# Altium footprint library Mylib.PcbLib: 320 footprints (part 3 of 20)
Each footprint in its own frame and in the unit in brackets; x right, y up, seen from the top. Pads: shape width x height; smd on the part's side, far side on the other; paste and mask are expansions set on the pad; w line width, h text height; cw(c..) or ccw(c..) is an arc to the next point about the centre after c.
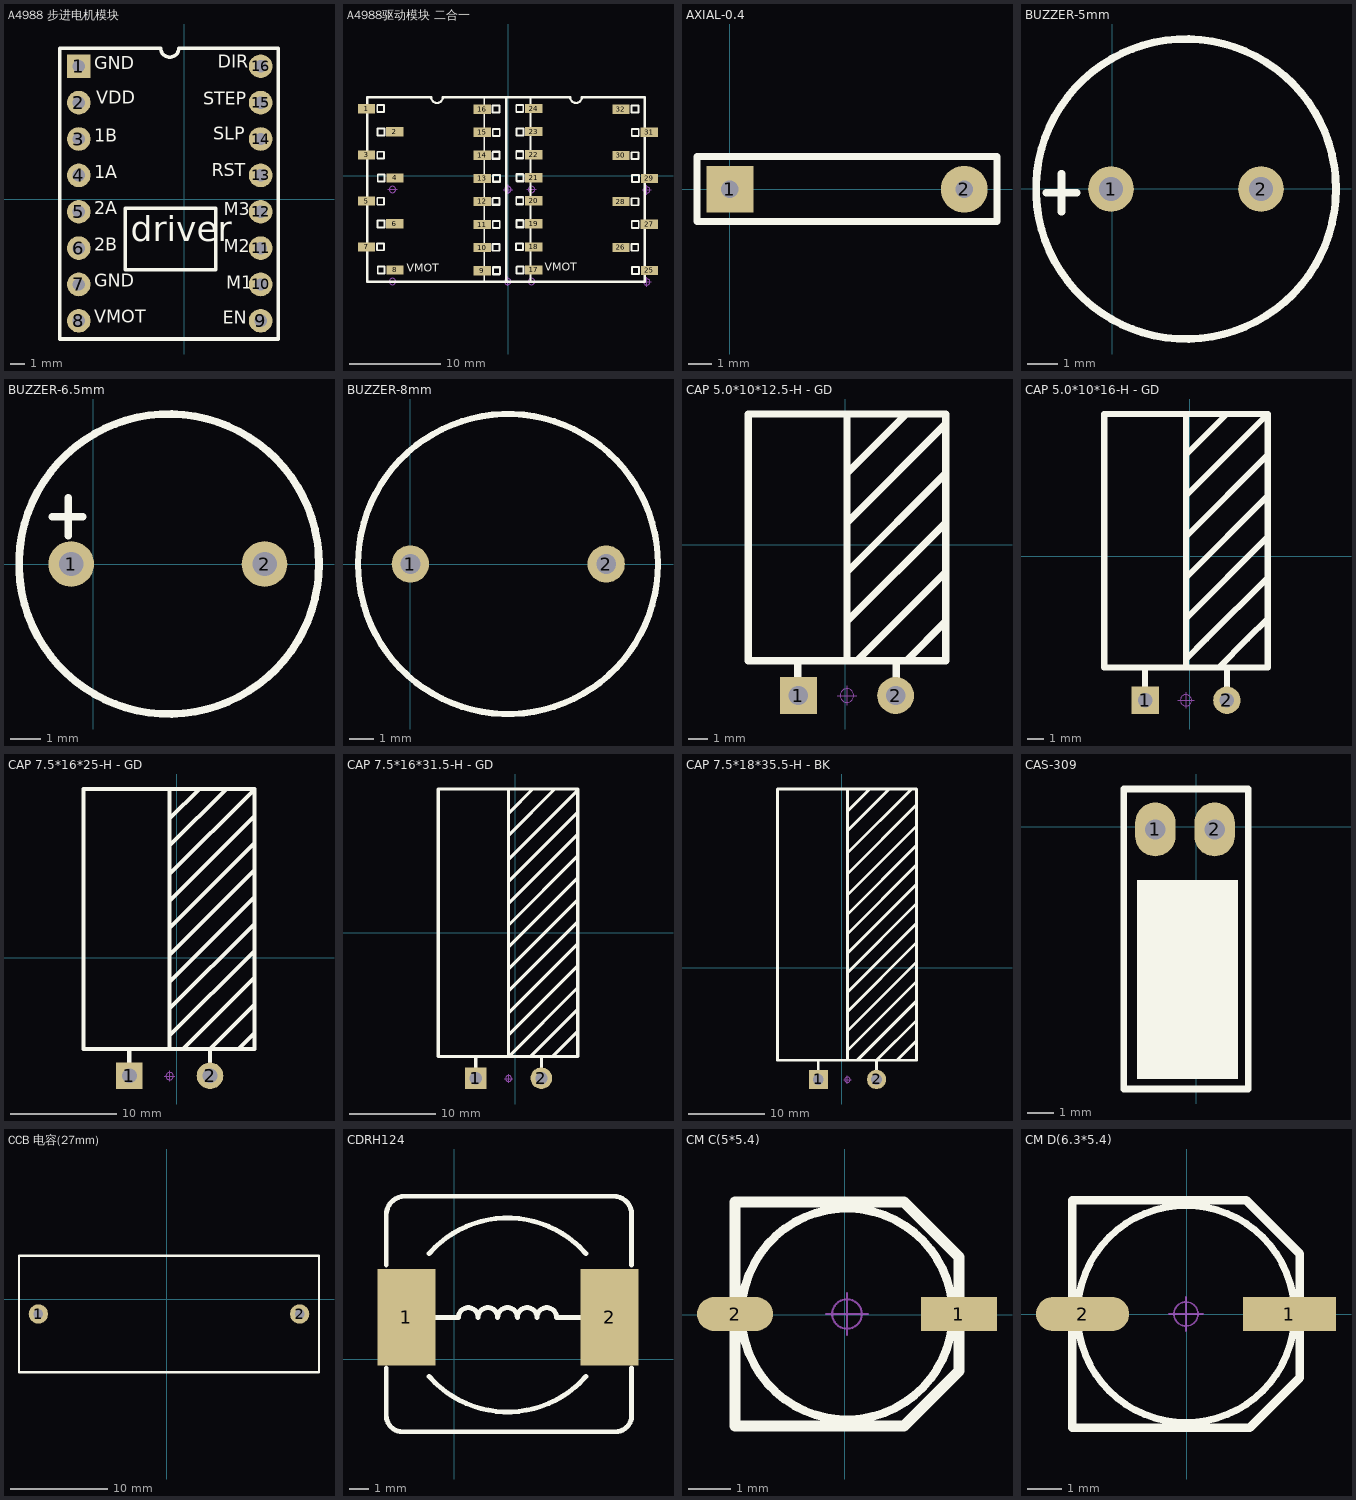
[diagram p2: the footprints below, top view; thin cyan lines are the x and y axes]

## A4988 步进电机模块 [mil] "步进电机模块"
pads (16):
  rect 65x65 hole 34: 1(-290,366)
  round 65 hole 34: 2(-290,266) 3(-290,166) 4(-290,66) 5(-290,-34) 6(-290,-134) 7(-290,-234) 8(-290,-334) 9(210,-334) 10(210,-234) 11(210,-134) 12(210,-34) 13(210,66) 14(210,166) 15(210,266) 16(210,366)
Top Overlay:
  lines w10: -342,-384 -342,416 -65,416 ccw(c-40,416) -15,416 258,416 258,-384 -342,-384 ; -162,-194 -162,-24 87,-24 87,-194 -162,-194
  text "driver" at -147,-138 h118.11
  text "EN" at 105.66,-355 h60
  text "SLP" at 80.07,151.98 h60
  text "RST" at 75.69,50.7 h60
  text "VDD" at -242,250.73 h60
  text "M1" at 114.88,-258.16 h60
  text "M2" at 109.16,-157.43 h60
  text "M3" at 108.83,-56.14 h60
  text "STEP" at 52.72,248.27 h60
  text "DIR" at 92.73,349 h60
  text "VMOT" at -247,-352 h60
  text "GND" at -247,-252.29 h60
  text "2B" at -247,-153.13 h60
  text "2A" at -247,-53.41 h60
  text "1A" at -247,46.3 h60
  text "1B" at -247,146.02 h60
  text "GND" at -247,346 h60
3D body "a4988-stepper-motor-driver-carrier.step": height 232.68, standoff 100, extent -342,-387 258,413

## A4988驱动模块 二合一 [mm]
pads (32):
  rect 1.9x1.02 smd: 1(-15.626,7.366) 2(-12.517,4.826) 3(-15.626,2.286) 4(-12.492,-0.254) 5(-15.626,-2.794) 6(-12.517,-5.309) 7(-15.626,-7.849) 8(-12.492,-10.389) 9(-2.901,-10.465) 10(-2.901,-7.925) 11(-2.901,-5.385) 12(-2.901,-2.845) 13(-2.901,-0.305) 14(-2.901,2.235) 15(-2.901,4.775) 16(-2.901,7.315) 17(2.799,-10.389) 18(2.799,-7.849) 19(2.799,-5.309) 20(2.799,-2.769) 21(2.799,-0.229) 22(2.799,2.311) 23(2.799,4.851) 24(2.799,7.391) 25(15.525,-10.443) 26(12.39,-7.903) 27(15.499,-5.363) 28(12.39,-2.848) 29(15.525,-0.308) 30(12.39,2.232) 31(15.499,4.772) 32(12.39,7.312)
Top Overlay:
  drawing of 207 lines, arcs and shapes, not listed
  text "VMOT" at 3.988,-10.795 h1.52
  text "VMOT" at -11.227,-10.897 h1.52
Mechanical 15:
  circle w0.05: c2.54,-1.524 r0.35
  circle w0.05: c2.54,-11.659 r0.35
  circle w0.05: c15.24,-1.578 r0.35
  circle w0.05: c15.24,-11.713 r0.35
  circle w0.05: c-12.776,-1.524 r0.35
  circle w0.05: c-12.776,-11.659 r0.35
  circle w0.05: c-0.076,-1.527 r0.35
  circle w0.05: c-0.076,-11.662 r0.35
  circle w0.05: c-0.051,-1.524 r0.35
  lines w0.05: -13.276,-11.659 -12.276,-11.659 ; -13.276,-1.524 -12.276,-1.524 ; -0.576,-11.713 0.424,-11.713 ; -0.576,-1.578 0.424,-1.578 ; -0.551,-1.575 0.449,-1.575 ; -0.076,-12.136 -0.076,-11.136 ; -0.076,-2.002 -0.076,-1.002 ; -0.051,-1.999 -0.051,-0.999 ; 2.04,-11.659 3.04,-11.659 ; 2.04,-1.524 3.04,-1.524 ; 14.74,-11.713 15.74,-11.713 ; 14.74,-1.578 15.74,-1.578 ; 15.24,-12.213 15.24,-11.213 ; 15.24,-2.078 15.24,-1.078
3D body "HDR2.54 2x1P_M.STEP": height 5.15, standoff 0, extent -3.251,6.015 3.149,8.615
3D body "HDR2.54 2x1P_M.STEP": height 5.15, standoff 0, extent -3.251,3.475 3.149,6.075
3D body "HDR2.54 2x1P_M.STEP": height 5.15, standoff 0, extent -3.251,0.935 3.149,3.535
3D body "HDR2.54 2x1P_M.STEP": height 5.15, standoff 0, extent -3.251,-1.605 3.149,0.995
3D body "HDR2.54 2x1P_M.STEP": height 5.15, standoff 0, extent -3.251,-4.145 3.149,-1.545
3D body "HDR2.54 2x1P_M.STEP": height 5.15, standoff 0, extent -3.251,-11.765 3.149,-9.165
3D body "HDR2.54 2x1P_M.STEP": height 5.15, standoff 0, extent -3.251,-9.225 3.149,-6.625
3D body "HDR2.54 2x1P_M.STEP": height 5.15, standoff 0, extent -3.251,-6.685 3.149,-4.085
3D body "a4988-stepper-motor-driver-carrier-black-edition.step": height 11.87, standoff 0, extent -0.229,-11.76 15.011,8.56
3D body "a4988-stepper-motor-driver-carrier-black-edition.step": height 11.87, standoff 0, extent -15.545,-11.76 -0.305,8.56

## AXIAL-0.4 [mil]
pads (2):
  rect 80x80 hole 30: 1(0,0)
  round 80 hole 30: 2(400,0)
Top Overlay:
  lines w12: -56,-55 456,-55 456,56 -56,56 -56,-55
3D body: height 139.21, standoff -100, extent -13.17,-68.75 408.83,69.88

## BUZZER-5mm [mil]
pads (2):
  round 60 hole 32 mask+0: 1(-1.46,-0.35) 2(195.39,-0.35)
Top Overlay:
  circle w10: c96.97,-0.35 r196.85
  lines w10: -86.46,-5.35 -46.46,-5.35 ; -66.46,-30.35 -66.46,19.65
3D body "蜂?": height 354.33, standoff -78.74, extent -142.67,-236.57 329.77,235.87

## BUZZER-6.5mm [mil]
pads (2):
  round 60 hole 32 mask+0: 1(-29,0) 2(224.85,0)
Top Overlay:
  circle w10: c99.43,0 r196.85
  lines w10: -54,62 -14,62 ; -33,37 -33,87
3D body "蜂?": height 354.33, standoff -78.74, extent -140.21,-236.21 332.23,236.23

## BUZZER-8mm [mil]
pads (2):
  round 60 hole 32 mask+0: 1(0,0) 2(314.96,0)
Top Overlay:
  circle w10: c157,0 r241.2
3D body: height 379.92, standoff -177.17, extent -81.05,-238.44 527.05,234

## CAP 5.0*10*12.5-H - GD [mm] "脚距5mm直径10mm高度12.5mm"
pads (2):
  rect 1.9x1.9 hole 1: 1(-2.398,-7.747)
  round 1.9 hole 1: 2(2.602,-7.747)
Top Overlay:
  lines w0.381: -2.438,-6.985 -2.438,-5.969 ; 0.102,-5.969 0.102,6.663 ; 0.102,-3.937 5.182,1.143 ; 0.102,-1.397 5.182,3.683 ; 0.102,1.143 5.182,6.223 ; 0.102,3.683 3.15,6.731 ; 0.61,-5.969 5.182,-1.397 ; 2.642,-6.985 2.642,-5.969 ; 3.15,-5.969 5.182,-3.937 ; -4.978,-5.969 -4.978,6.731 5.182,6.731 5.182,-5.969 -4.978,-5.969
Mechanical 15:
  circle w0.05: c0.102,-7.747 r0.35
  lines w0.05: -0.398,-7.747 0.602,-7.747 ; 0.102,-8.247 0.102,-7.247
3D body "CAP 5X10X12.5-H.STEP": height 10.03, standoff -3.48, extent -4.898,-8.047 5.112,6.663

## CAP 5.0*10*16-H - GD [mm] "脚距5mm直径10mm高度16mm"
pads (2):
  rect 1.7x1.7 hole 0.9: 1(-2.78,-8.961)
  round 1.7 hole 0.9: 2(2.3,-8.961)
Top Overlay:
  lines w0.381: -2.78,-8.199 -2.78,-7.183 -2.78,-6.929 ; -0.24,-6.929 -0.24,-6.421 ; -0.24,-5.151 -0.24,8.819 ; -0.24,-4.897 -0.24,-6.421 ; -0.24,-3.881 4.84,1.199 ; -0.24,-1.341 4.84,3.739 ; -0.24,1.199 4.84,6.279 ; -0.24,3.739 4.84,8.819 ; -0.24,6.279 2.3,8.819 ; 1.792,-6.929 3.57,-5.151 4.84,-3.881 ; 2.3,-8.199 2.3,-7.183 2.3,-6.929 ; 4.84,-1.341 1.03,-5.151 -0.24,-6.421 ; 4.84,8.819 4.84,-6.929 -5.32,-6.929 -5.32,8.819 4.84,8.819
Mechanical 15:
  circle w0.05: c-0.24,-8.961 r0.35
  lines w0.05: -0.74,-8.961 0.26,-8.961 ; -0.24,-9.461 -0.24,-8.461
3D body "CAP 5X10X16-H.STEP": height 10.03, standoff -3.48, extent -5.28,-9.261 4.73,8.949

## CAP 7.5*16*25-H - GD [mm] "脚距7.5mm直径16mm高度25mm"
pads (2):
  rect 2.5x2.5 hole 1.4: 1(-4.486,-11.138)
  round 2.5 hole 1.4: 2(3.114,-11.138)
Top Overlay:
  lines w0.381: -4.496,-9.906 -4.496,-8.636 ; -0.686,-8.636 -0.686,15.875 ; -0.686,-7.366 7.315,0.635 ; -0.686,-4.826 7.315,3.175 ; -0.686,-2.286 7.315,5.715 ; -0.686,0.254 7.315,8.255 ; -0.686,2.794 7.252,10.731 ; -0.686,5.334 7.252,13.271 ; -0.686,7.874 7.243,15.803 ; -0.686,10.541 4.648,15.875 ; -0.686,13.081 2.108,15.875 ; 0.584,-8.636 7.315,-1.905 ; 3.124,-9.906 3.124,-8.636 7.315,-4.445 ; 5.791,-8.636 7.315,-7.112 ; -8.814,-8.636 7.315,-8.636 7.315,15.875 -8.814,15.875 -8.814,-8.636
Mechanical 15:
  circle w0.05: c-0.686,-11.176 r0.35
  lines w0.05: -1.186,-11.176 -0.186,-11.176 ; -0.686,-11.676 -0.686,-10.676
3D body "CAP 7.5X16X25-H.STEP": height 16.03, standoff -3.48, extent -8.736,-11.638 7.274,15.772

## CAP 7.5*16*31.5-H - GD [mm] "脚距7.5mm直径16mm高度31.5mm"
pads (2):
  rect 2.5x2.5 hole 1.4: 1(-4.593,-16.864)
  round 2.5 hole 1.4: 2(3.007,-16.864)
Top Overlay:
  lines w0.381: -4.603,-15.632 -4.603,-14.362 ; -0.793,-11.822 7.208,-3.821 ; -0.793,-9.282 7.145,-1.344 ; -0.793,-6.742 7.145,1.196 ; -0.793,-4.202 7.145,3.736 ; -0.793,-1.662 7.145,6.276 ; -0.793,0.878 7.145,8.816 ; -0.793,3.418 7.145,11.356 ; -0.793,5.958 7.145,13.896 ; -0.793,8.498 7.137,16.427 ; -0.793,11.292 4.541,16.626 ; -0.793,13.832 2.001,16.626 ; -0.793,16.626 -0.793,-14.362 7.208,-6.361 ; 1.747,-14.362 7.208,-8.901 ; 3.017,-15.632 3.017,-14.362 ; 4.287,-14.362 7.208,-11.441 ; -8.921,-14.362 -8.921,16.626 7.208,16.626 7.208,-14.362 -8.921,-14.362
Mechanical 15:
  circle w0.05: c-0.793,-16.902 r0.35
  lines w0.05: -1.293,-16.902 -0.293,-16.902 ; -0.793,-17.402 -0.793,-16.402
3D body "CAP 7.5X16X31.5-H.STEP": height 16.03, standoff -3.48, extent -8.843,-17.364 7.167,16.546

## CAP 7.5*18*35.5-H - BK [mm] "脚距7.5mm直径18mm高度35.5mm"
pads (2):
  rect 2.5x2.5 hole 1.4: 1(-3.033,-14.594)
  round 2.5 hole 1.4: 2(4.567,-14.594)
Top Overlay:
  lines w0.381: -3.043,-13.363 -3.043,-12.093 ; 0.767,-12.093 0.767,23.347 ; 0.767,-10.823 9.722,-1.868 ; 0.767,-8.283 9.742,0.692 ; 0.767,-5.743 9.732,3.222 ; 0.767,-3.203 9.752,5.782 ; 0.767,-0.663 9.742,8.312 ; 0.767,1.877 9.732,10.842 ; 0.767,4.417 9.752,13.402 ; 0.767,6.957 9.742,15.932 ; 0.767,9.497 9.732,18.462 ; 0.767,12.247 9.737,21.217 ; 0.787,14.987 9.127,23.327 ; 0.827,17.964 6.161,23.298 ; 0.827,20.504 3.621,23.298 ; 2.037,-12.093 9.762,-4.368 ; 4.577,-13.363 4.577,-12.093 9.772,-6.898 ; 7.244,-12.093 9.755,-9.581 ; -8.353,-12.093 -8.353,23.347 9.767,23.347 9.767,-12.093 -8.353,-12.093
Mechanical 15:
  circle w0.05: c0.767,-14.633 r0.35
  lines w0.05: 0.267,-14.633 1.267,-14.633 ; 0.767,-15.133 0.767,-14.133
3D body "CAP 7.5X18X35.5-H.STEP": height 18.03, standoff -3.48, extent -8.283,-15.095 9.727,23.315

## CAS-309 [mil]
pads (2):
  oval 60x80 hole 30: 1(-61,-4) 2(27,-4)
Top Overlay:
  rectangle: -88,-374 62,-79
  lines w10: -108,-389 77,-389 77,56 -108,56 -108,-389
3D body: height 365.16, standoff -59.06, extent -81.91,-72 53.91,53.94

## CCB 电容(27mm) [mm]
pads (2):
  round 2 hole 1: 1(-13.291,-1.524) 2(13.709,-1.524)
Top Overlay:
  lines w0.254: -15.291,-7.524 15.709,-7.524 15.709,4.476 -15.291,4.476 -15.291,-7.524
3D body "User Library-CBB81_W31_0_H20_5_T12_0_P27_0.STEP": height 23.5, standoff -10, extent -15.291,-7.524 15.706,4.476

## CDRH124 [mm]
pads (2):
  rect 3x5 smd: 1(-2.469,2.159) 2(8.057,2.159)
Top Overlay:
  lines w0.254: -3.505,-0.457 -3.505,-2.921 ccw(c-2.667,-2.921) -2.667,-3.759 -2.235,-3.759 7.925,-3.759 8.357,-3.759 ccw(c8.357,-2.921) 9.195,-2.921 9.195,-0.457 ; -3.505,4.877 -3.505,7.468 cw(c-2.54,7.468) -2.54,8.433 -2.235,8.433 7.925,8.433 8.255,8.433 cw(c8.255,7.493) 9.195,7.493 9.195,4.877 ; -1.295,-0.889 ccw(c2.769,2.667) 6.833,-0.889 ; -1.295,5.461 cw(c2.769,1.905) 6.833,5.461 ; -1.041,2.159 0.229,2.159 cw(c0.737,2.159) 1.245,2.159 cw(c1.753,2.159) 2.261,2.159 cw(c2.769,2.159) 3.277,2.159 cw(c3.785,2.159) 4.293,2.159 cw(c4.801,2.159) 5.309,2.159 6.579,2.159
3D body "CDRH124.STEP": height 4.55, standoff 0.05, extent -3.11,-3.77 8.89,8.23

## CM C(5*5.4) [mm] "贴片电解电容，直径5mm，高5.4mm"
pads (2):
  rect 1.8x0.8 smd: 1(2.708,0.012)
  oval 1.8x0.8 smd: 2(-2.592,0.012)
Top Overlay:
  circle w0.2: c0.058,0.012 r2.5
  lines w0.254: -2.592,-2.638 1.408,-2.638 2.708,-1.338 2.708,1.362 1.408,2.662 -2.592,2.662 -2.592,-2.638
Mechanical 15:
  circle w0.05: c0.058,0.012 r0.35
  lines w0.05: -0.442,0.012 0.558,0.012 ; 0.058,-0.488 0.058,0.512
3D body "CM C(5X5.4).STEP": height 5.4, standoff -0.01, extent -2.892,-2.637 3.008,2.662

## CM D(6.3*5.4) [mm] "贴片电解电容，直径6.3mm，高5.4mm"
pads (2):
  rect 2.7x1 smd: 1(2.975,0)
  oval 2.7x1 smd: 2(-3.025,0)
Top Overlay:
  circle w0.2: c-0.025,0 r3.15
  lines w0.254: -3.325,-3.3 -3.325,3.3 1.725,3.3 3.275,1.75 3.275,-1.85 1.825,-3.3 -3.325,-3.3
Mechanical 15:
  circle w0.05: c-0.025,0 r0.35
  lines w0.05: -0.525,0 0.475,0 ; -0.025,-0.5 -0.025,0.5
3D body "CM D(6.3X5.4).STEP": height 5.4, standoff -0.01, extent -3.525,-3.3 3.475,3.3